# Altium footprint library PCB贴片元件封装库.pcblib: 366 footprints (part 17 of 23)
Each footprint in its own frame and in the unit in brackets; x right, y up, seen from the top. Pads: shape width x height; smd on the part's side, far side on the other; paste and mask are expansions set on the pad; w line width, h text height; cw(c..) or ccw(c..) is an arc to the next point about the centre after c.
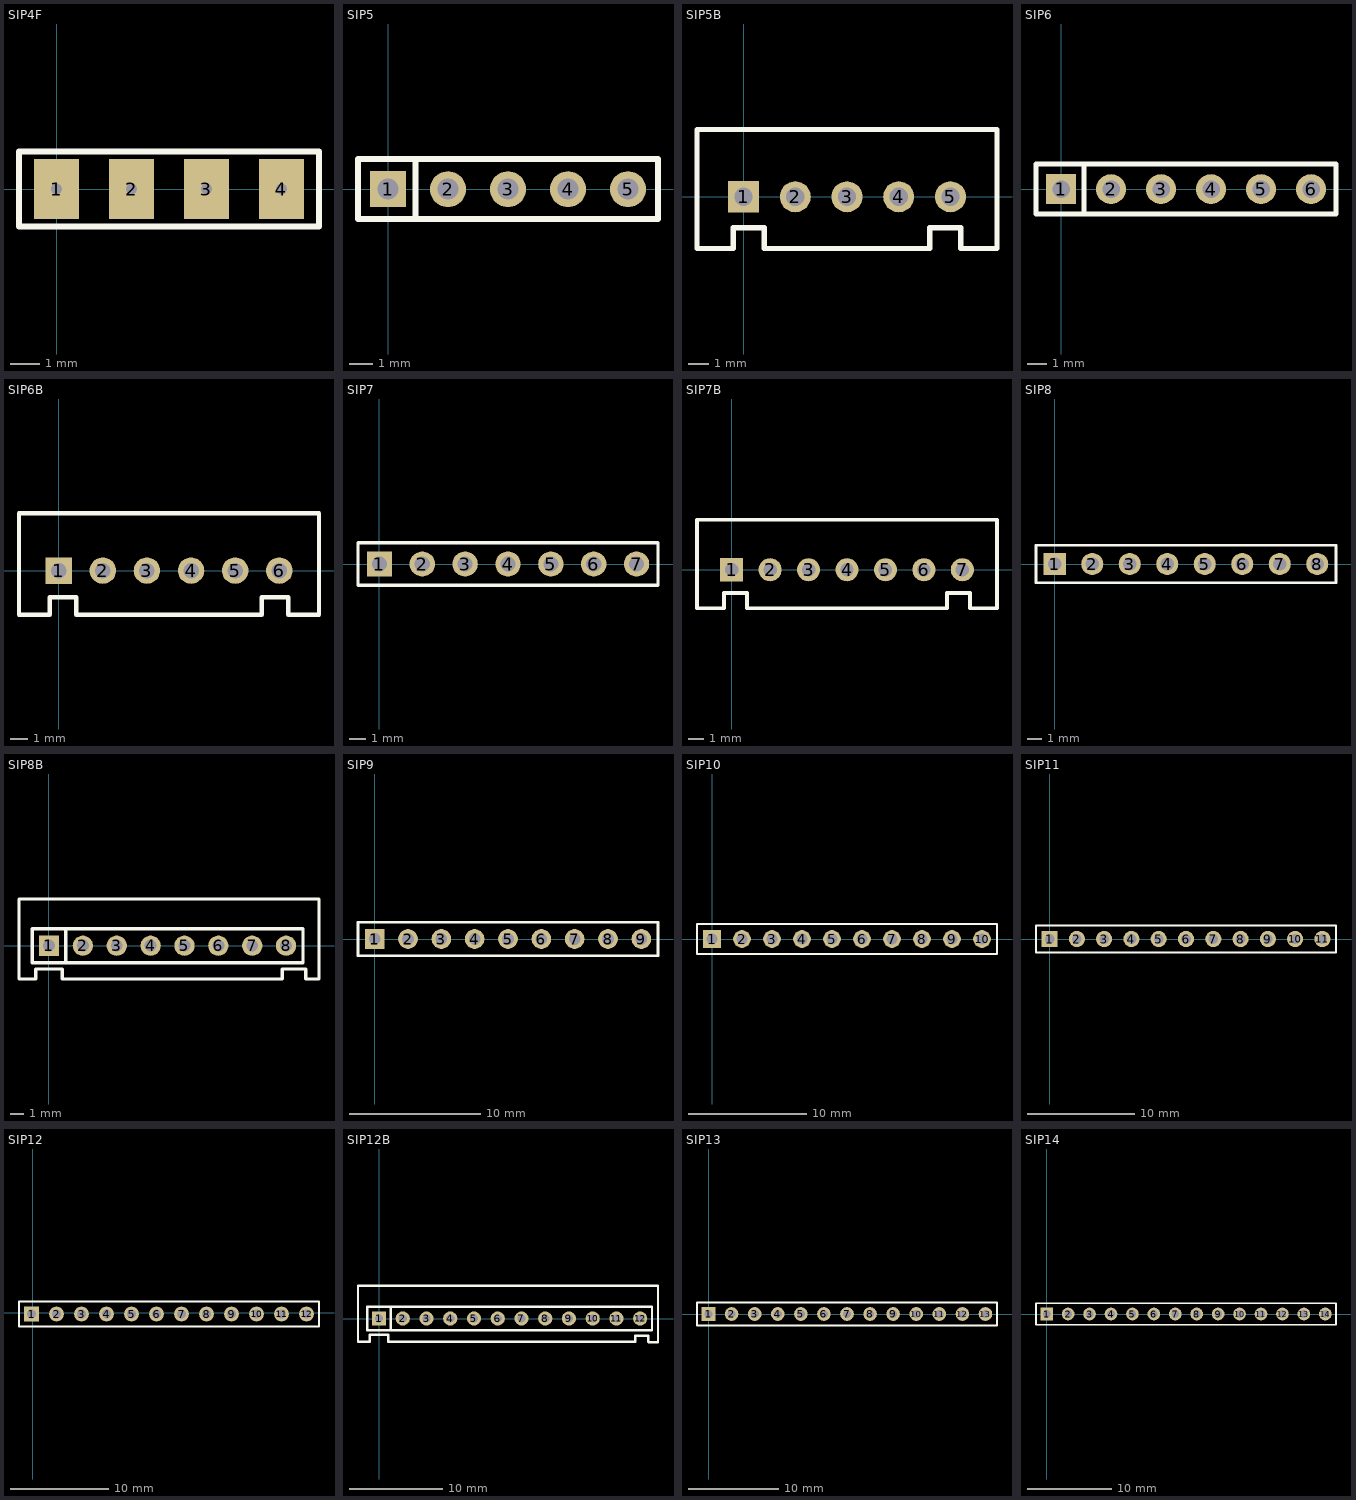
[diagram p16: the footprints below, top view; thin cyan lines are the x and y axes]

## SIP4F [mil]
pads (4):
  rect 60x80 hole 15: 1(0,0) 2(100,0) 3(200,0) 4(300,0)
TopOverlay:
  lines w7.87: -50,-50 350,-50 350,50 -50,50 -50,-50

## SIP5 [mil]
pads (5):
  rect 60x60 hole 35: 1(0,0)
  round 60 hole 35: 2(100,0) 3(200,0) 4(300,0) 5(400,0)
TopOverlay:
  lines w10: 45.67,-49.21 45.67,50.79 ; -50,-50 450,-50 450,50 -50,50 -50,-50

## SIP5B [mil]
pads (5):
  rect 60x60 hole 35: 1(0,0)
  round 60 hole 35: 2(100,0) 3(200,0) 4(300,0) 5(400,0)
TopOverlay:
  lines w10: -90,-100 -20,-100 -20,-60 40,-60 40,-100 360,-100 360,-60 420,-60 420,-100 490,-100 490,130 -90,130 -90,-100

## SIP6 [mil]
pads (6):
  rect 60x60 hole 35: 1(0,0)
  round 60 hole 35: 2(100,0) 3(200,0) 4(300,0) 5(400,0) 6(500,0)
TopOverlay:
  lines w10: 45.67,-49.21 45.67,50.79 ; -50,-50 550,-50 550,50 -50,50 -50,-50

## SIP6B [mil]
pads (6):
  rect 60x60 hole 35: 1(0,0)
  round 60 hole 35: 2(100,0) 3(200,0) 4(300,0) 5(400,0) 6(500,0)
TopOverlay:
  lines w10: -90,-100 -90,130 590,130 590,-100 520,-100 520,-60 460,-60 460,-100 40,-100 40,-60 -20,-60 -20,-100 -90,-100

## SIP7 [mm]
pads (7):
  rect 1.5x1.5 hole 0.9: 1(0,0)
  round 1.5 hole 0.9: 2(2.54,0) 3(5.08,0) 4(7.62,0) 5(10.16,0) 6(12.7,0) 7(15.24,0)
TopOverlay:
  lines w0.2: -1.27,-1.27 16.51,-1.27 16.51,1.27 -1.27,1.27 -1.27,-1.27

## SIP7B [mil]
pads (7):
  rect 60x60 hole 35: 1(0,0)
  round 60 hole 35: 2(100,0) 3(200,0) 4(300,0) 5(400,0) 6(500,0) 7(600,0)
TopOverlay:
  lines w10: -90,-100 -90,130 690,130 690,-100 620,-100 620,-60 560,-60 560,-100 40,-100 40,-60 -20,-60 -20,-100 -90,-100

## SIP8 [mm]
pads (8):
  rect 1.5x1.5 hole 0.9: 1(0,0)
  round 1.5 hole 0.9: 2(2.54,0) 3(5.08,0) 4(7.62,0) 5(10.16,0) 6(12.7,0) 7(15.24,0) 8(17.78,0)
TopOverlay:
  lines w0.2: -1.27,-1.27 19.05,-1.27 19.05,1.27 -1.27,1.27 -1.27,-1.27

## SIP8B [mil]
pads (8):
  rect 60x60 hole 35: 1(0,0)
  round 60 hole 35: 2(100,0) 3(200,0) 4(300,0) 5(400,0) 6(500,0) 7(600,0) 8(700,0)
TopOverlay:
  lines w10: 50,-50 50,50 ; -88.58,-98.42 -88.58,137.79 797.25,137.79 797.25,-98.42 757.88,-98.42 757.88,-68.9 748.03,-68.9 688.98,-68.9 688.98,-98.42 39.37,-98.42 39.37,-68.9 -39.37,-68.9 -39.37,-98.42 -88.58,-98.42 ; -50,-50 750,-50 750,50 -50,50 -50,-50

## SIP9 [mm]
pads (9):
  rect 1.5x1.5 hole 0.9: 1(0,0)
  round 1.5 hole 0.9: 2(2.54,0) 3(5.08,0) 4(7.62,0) 5(10.16,0) 6(12.7,0) 7(15.24,0) 8(17.78,0) 9(20.32,0)
TopOverlay:
  lines w0.2: -1.27,-1.27 21.59,-1.27 21.59,1.27 -1.27,1.27 -1.27,-1.27

## SIP10 [mm]
pads (10):
  rect 1.5x1.5 hole 0.9: 1(0,0)
  round 1.5 hole 0.9: 2(2.54,0) 3(5.08,0) 4(7.62,0) 5(10.16,0) 6(12.7,0) 7(15.24,0) 8(17.78,0) 9(20.32,0) 10(22.86,0)
TopOverlay:
  lines w0.2: -1.27,-1.27 -1.27,1.27 0.635,1.27 24.13,1.27 24.13,-1.27 -1.27,-1.27

## SIP11 [mm]
pads (11):
  rect 1.5x1.5 hole 0.9: 1(0,0)
  round 1.5 hole 0.9: 2(2.54,0) 3(5.08,0) 4(7.62,0) 5(10.16,0) 6(12.7,0) 7(15.24,0) 8(17.78,0) 9(20.32,0) 10(22.86,0) 11(25.4,0)
TopOverlay:
  lines w0.2: -1.27,-1.27 -1.27,1.27 0.635,1.27 26.67,1.27 26.67,-1.27 -1.27,-1.27

## SIP12 [mm]
pads (12):
  rect 1.5x1.5 hole 0.9: 1(-0.127,-0.127)
  round 1.5 hole 0.9: 2(2.413,-0.127) 3(4.953,-0.127) 4(7.493,-0.127) 5(10.033,-0.127) 6(12.573,-0.127) 7(15.113,-0.127) 8(17.653,-0.127) 9(20.193,-0.127) 10(22.733,-0.127) 11(25.273,-0.127) 12(27.813,-0.127)
TopOverlay:
  lines w0.2: -1.397,-1.397 29.083,-1.397 29.083,1.143 0.508,1.143 -1.397,1.143 -1.397,-1.397

## SIP12B [mil]
pads (12):
  rect 60x60 hole 35: 1(0,0)
  round 60 hole 35: 2(100,0) 3(200,0) 4(300,0) 5(400,0) 6(500,0) 7(600,0) 8(700,0) 9(800,0) 10(900,0) 11(1000,0) 12(1100,0)
TopOverlay:
  lines w10: 50,-50 50,50 ; 411.42,-98.42 460.63,-98.42 ; 719,-50 1150,-50 1150,49 ; 728.35,-50 946,-50 ; 750,-50 -50,-50 -50,50 ; 750,50 -50,50 ; 789.98,137.79 986.83,137.79 ; 797.24,137.79 -88.58,137.79 -88.58,-98.42 -39.37,-98.42 -39.37,-68.9 39.37,-68.9 39.37,-98.42 688.98,-98.42 865.58,-98.42 1079,-98.42 1079,-73 1134,-73 1134,-97.42 ; 897,137.79 1175.2,137.79 1175.2,-92.2 1175.2,-99.8 1136.37,-99.8 ; 924,50 1149,50 ; 946,50 -50,50

## SIP13 [mm]
pads (13):
  rect 1.5x1.5 hole 0.9: 1(0,0)
  round 1.5 hole 0.9: 2(2.54,0) 3(5.08,0) 4(7.62,0) 5(10.16,0) 6(12.7,0) 7(15.24,0) 8(17.78,0) 9(20.32,0) 10(22.86,0) 11(25.4,0) 12(27.94,0) 13(30.48,0)
TopOverlay:
  lines w0.2: -1.27,-1.27 -1.27,1.27 0.635,1.27 31.75,1.27 31.75,-1.27 -1.27,-1.27

## SIP14 [mm]
pads (14):
  rect 1.5x1.5 hole 0.9: 1(0,0)
  round 1.5 hole 0.9: 2(2.54,0) 3(5.08,0) 4(7.62,0) 5(10.16,0) 6(12.7,0) 7(15.24,0) 8(17.78,0) 9(20.32,0) 10(22.86,0) 11(25.4,0) 12(27.94,0) 13(30.48,0) 14(33.02,0)
TopOverlay:
  lines w0.2: -1.27,-1.27 -1.27,1.27 0.635,1.27 34.29,1.27 34.29,-1.27 -1.27,-1.27